# Altium footprint library Connectors.PCBLIB: 109 footprints (part 6 of 7)
Each footprint in its own frame and in the unit in brackets; x right, y up, seen from the top. Pads: shape width x height; smd on the part's side, far side on the other; paste and mask are expansions set on the pad; w line width, h text height; cw(c..) or ccw(c..) is an arc to the next point about the centre after c.
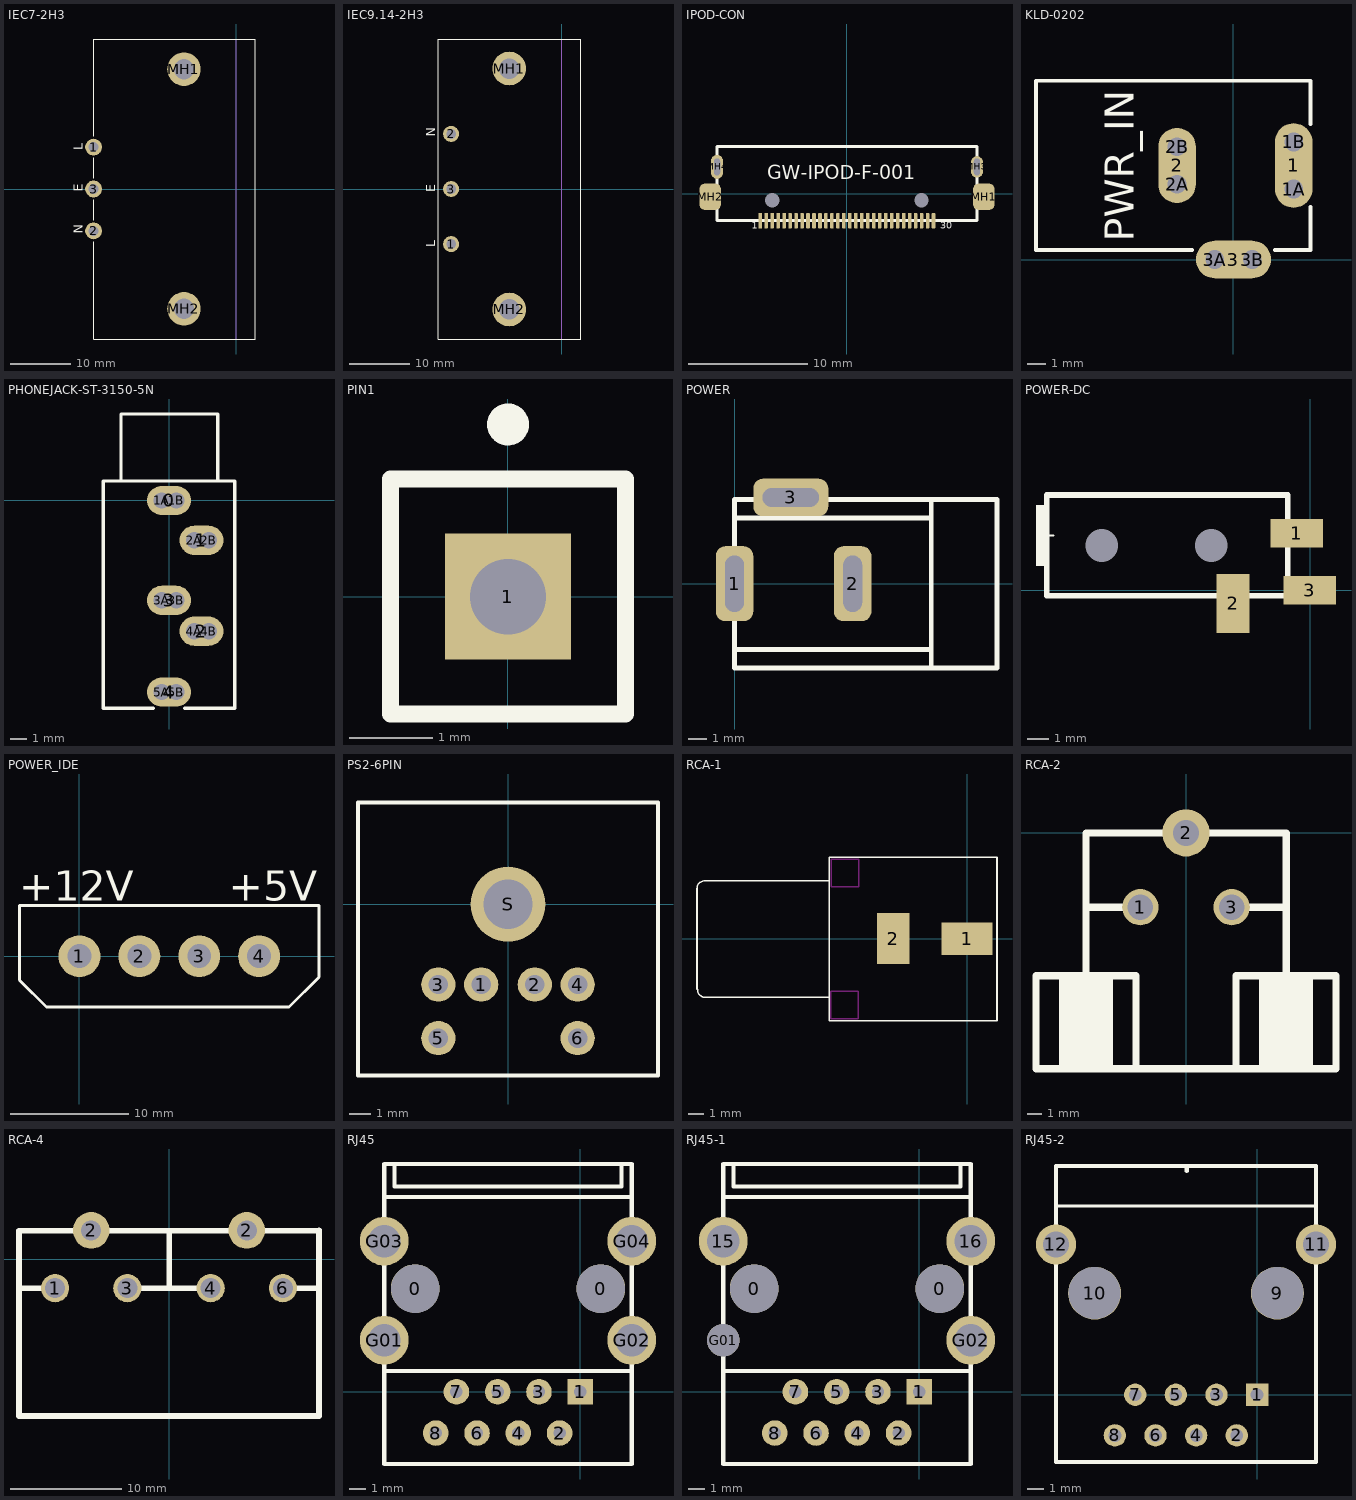
[diagram p5: the footprints below, top view; thin cyan lines are the x and y axes]

## IEC7-2H3 [mm] "Mains Power Outlet, IEC60 320-2-2 F, PC Flange Rear Mount"
height 30.4
pads (5):
  round 2.8 hole 1.7: 1(-23.8,7) 2(-23.8,-7) 3(-23.8,0)
  round 5.6 hole 3.4: MH1(-8.7,20) MH2(-8.7,-20)
Top Overlay:
  lines w0.2: -23.8,-8.8 -23.8,-25.05 3.2,-25.05 3.2,25.05 -23.8,25.05 -23.8,8.8 ; -23.8,-5.2 -23.8,-1.8 ; -23.8,1.8 -23.8,5.2
  text "L" at -25.6,6.5 h1.5
  text "E" at -25.6,-0.5 h1.5
  text "N" at -25.6,-7.5 h1.5
Mechanical 1:
  lines w0.1: 0,-25.05 0,25.05
  text "PCB Edge" at -0.4,-24.4 h0.5

## IEC9.14-2H3 [mm] "Mains Power Inlet, IEC60 320-1 C14, PC Flange Rear Mount"
height 27.8
pads (5):
  round 2.65 hole 1.6: 1(-18.35,-9.14) 2(-18.35,9.14) 3(-18.35,0)
  round 5.6 hole 3.4: MH1(-8.7,20) MH2(-8.7,-20)
Top Overlay:
  lines w0.2: -20.5,-24.9 -20.5,24.9 3.2,24.9 3.2,-24.9 -20.5,-24.9
  text "N" at -21,8.64 h1.5
  text "E" at -21,-0.5 h1.5
  text "L" at -21,-9.64 h1.5
Mechanical 1:
  lines w0.1: 0,-24.9 0,24.9
  text "PCB Edge" at -0.383,-24.4 h0.5

## IPOD-CON [mm]
height 2.5
pads (36):
  rect 0.3x1.3 smd: 1(-7.261,-2.25)
  rrect50% 0.3x1.3 smd: 2(-6.761,-2.25) 3(-6.261,-2.25) 4(-5.761,-2.25) 5(-5.261,-2.25) 6(-4.761,-2.25) 7(-4.261,-2.25) 8(-3.761,-2.25) 9(-3.261,-2.25) 10(-2.761,-2.25) 11(-2.261,-2.25) 12(-1.761,-2.25) 13(-1.261,-2.25) 14(-0.761,-2.25) 15(-0.261,-2.25) 16(0.239,-2.25) 17(0.739,-2.25) 18(1.239,-2.25) 19(1.739,-2.25) 20(2.239,-2.25) 21(2.739,-2.25) 22(3.239,-2.25) 23(3.739,-2.25) 24(4.239,-2.25) 25(4.739,-2.25) 26(5.239,-2.25) 27(5.739,-2.25) 28(6.239,-2.25) 29(6.739,-2.25) 30(7.239,-2.25)
  rrect50% 1.8x2.2 smd: MH1(11.45,-0.25) MH2(-11.45,-0.25)
  oval 1x1.8 hole 0.5 slot 1.4 at 90 deg: MH3(10.875,2.25)
  oval 1x2 hole 0.5 slot 1.4 at 90 deg: MH4(-10.875,2.25)
  rrect50% 0.3x0 hole 1.2: ""(-6.261,-0.55) ""(6.239,-0.55)
Top Overlay:
  lines w0.254: -10.875,-2.25 10.875,-2.25 10.875,3.95 -10.875,3.95 -10.875,-2.25
  text "1" at -7.95,-3.15 h1
  text "30" at 7.798,-3.15 h1
  text "GW-IPOD-F-001" at -6.655,0.813 h2
3D body: height 2.2, standoff 0, extent -11.409,-1.968 11.308,3.632

## KLD-0202 [mm] "DC Power Jack, 2.5mm, KLD Series, PCB Mount"
pads (9):
  oval 2x4.5 all layers, no hole: 1(3.2,5)
  round 1.5 hole 1: 1A(3.2,3.75) 1B(3.2,6.25) 2A(-3,4) 2B(-3,6) 3A(-1,0) 3B(1,0)
  oval 2x4 all layers, no hole: 2(-3,5)
  oval 4x2 all layers, no hole: 3(0,0)
Top Overlay:
  lines w0.2: -2.2,0.5 -10.5,0.5 -10.5,9.5 4.1,9.5 4.1,7.2 ; 2.2,0.5 4.1,0.5 4.1,2.8
  text "PWR_IN" at -5.293,0.936 h1.52
Mechanical 2:
  lines w1: -3,4 -3,6 ; -1,0 1,0 ; 3.2,3.75 3.2,6.25

## PHONEJACK-ST-3150-5N [mm] "Connector; Stereo Jack, 3.5mm, 5 Position"
pads (15):
  oval 2.7x1.8 all layers, no hole: 0(0,0) 1(2,-2.45) 2(2,-8.05) 3(0,-6.15) 4(0,-11.8)
  round 1.2 hole 1: 1A(-0.45,0) 1B(0.45,0) 2A(1.55,-2.45) 2B(2.45,-2.45) 3A(-0.45,-6.15) 3B(0.45,-6.15) 4A(1.55,-8.05) 4B(2.45,-8.05) 5A(-0.45,-11.8) 5B(0.45,-11.8)
Top Overlay:
  lines w0.2: -2.96,1.263 -2.96,5.327 3.009,5.327 3.009,1.263 ; -0.95,-12.8 -4.05,-12.8 -4.05,1.2 4.05,1.2 4.05,-12.8 0.95,-12.8
Mechanical 2:
  lines w1: -0.45,-11.8 0.45,-11.8 ; -0.45,-6.15 0.45,-6.15 ; -0.45,0 0.45,0 ; 1.55,-8.05 2.45,-8.05 ; 1.55,-2.45 2.45,-2.45

## PIN1 [mm] "Connector; Coax-F"
pads (1):
  rect 1.5x1.5 hole 0.9: 1(0,0)
Top Overlay:
  circle w0.25: c0,2.05 r0.125
  lines w0.2: -1.4,-1.4 -1.4,1.4 1.4,1.4 1.4,-1.4 -1.4,-1.4
3D body: height 8.54, standoff -3, extent -1.27,-1.27 1.27,1.27

## POWER [mm]
pads (3):
  rrect50% 2x4 hole 1 slot 3 at 90 deg: 1(0,0) 2(6.3,0)
  rrect50% 4x2 hole 1 slot 3 at 0 deg: 3(3,4.6)
Top Overlay:
  lines w0.254: 0,-3.505 10.49,-3.505 ; 0,3.505 10.49,3.505 ; 10.49,-4.496 10.49,4.496 ; 0,-4.496 0,4.496 13.995,4.496 13.995,-4.496 0,-4.496
3D body: height 11.02, standoff -3.48, extent -0.043,-4.503 13.783,5.003

## POWER-DC [mm]
pads (5):
  round 0 hole 1.5 mask+0: 0(-9.521,2.057) 0(-4.521,2.057)
  rect 2.4x1.3 smd: 1(-0.621,2.607) 3(-0.021,0.007)
  rect 1.5x2.7 smd: 2(-3.521,-0.593)
Top Overlay:
  rectangle: -12.521,1.107 -11.921,3.907
  lines w0.1: -12.221,2.507 -11.721,2.507
  lines w0.254: -12.021,-0.243 -12.021,4.357 -1.021,4.357 -1.021,-0.243 -12.021,-0.243
3D body: height 4.4, standoff -0.8, extent -11.996,-1.818 0.604,4.482

## POWER_IDE [mil]
pads (4):
  round 140 hole 80: 1(0,0) 2(200,0) 3(400,0) 4(600,0)
Top Overlay:
  lines w10: 640,-170 700,-170 ; 800,-40 800,-70 ; 700,-170 800,-70 ; 700,-170 -110,-170 -200,-80 -200,170 800,170 800,-70
  text "+12V" at -202,185 h100
  text "+5V" at 498,185 h100
3D body: height 480, standoff 0, extent -158,-174 762,176

## PS2-6PIN [mm] "PS2 Socket, 6 Pin, Through Hole"
pads (7):
  round 1.6 hole 0.9: 1(-1.25,-3.75) 2(1.25,-3.75) 3(-3.25,-3.75) 4(3.25,-3.75) 5(-3.25,-6.25) 6(3.25,-6.25)
  round 3.5 hole 2.3: S(0,0)
Top Overlay:
  lines w0.2: -7,-8 7,-8 7,4.75 -7,4.75 -7,-8

## RCA-1 [mm]
pads (2):
  rect 3.3x2.1 all layers, no hole: 1(0,0)
  rect 2.1x3.3 all layers, no hole: 2(-4.75,0)
Top Overlay:
  lines w0.1: -17.383,-3.242 -17.383,3.225 cw(c-16.883,3.225) -16.875,3.725 -8.875,3.725 ; -17.35,-3.275 ccw(c-16.85,-3.283) -16.85,-3.783 ; -16.875,-3.775 -8.875,-3.775 ; -8.875,-5.275 -8.875,5.225 1.925,5.225 1.925,-5.275 -8.875,-5.275
Keep-Out Layer:
  lines w0.1: -8.775,-5.125 -8.75,-5.15 -7,-5.15 -7,-3.375 -8.775,-3.375 -8.775,-5.125 ; -8.75,3.325 -8.75,5.1 -6.975,5.1 -6.975,3.325 -8.75,3.325
Mechanical 1:
  lines w0.1: -5.375,-1.225 -4.175,-1.225 -4.175,1.175 -5.375,1.175 -5.375,-1.225 ; -1.175,-0.625 -1.175,0.575 1.225,0.575 1.225,-0.625 -1.175,-0.625
3D body: height 11.86, standoff -3.64, extent -17.628,-5 1.872,5

## RCA-2 [mm]
pads (3):
  round 2.54 hole 1.8: 1(-3.2,-5.2) 3(3.2,-5.2)
  round 3.3 hole 1.8: 2(0,0)
Top Overlay:
  rectangle: -8.738,-16.5 -5.309,-10
  rectangle: 5.283,-16.5 8.738,-10
  lines w0.254: -8.75,-16.5 -8.75,-10 ; -5.25,-16.5 -5.25,-10 ; 5.25,-16.5 5.25,-10 ; 8.75,-16.5 8.75,-10
  lines w0.508: -7,-5.2 -3.25,-5.2 ; -3.5,-16.5 -3.5,-10 -7,-10 -10.5,-10 -10.5,-16.5 -7,-16.5 ; 3.19,-5.2 7,-5.2 ; 3.5,-16.5 3.5,-10 7,-10 10.5,-10 10.5,-16.5 7.017,-16.5 7.017,0 ; 7,-16.5 -7,-16.5 ; 7,0 -7,0 -7,-16.5
3D body: height 28.01, standoff -4.39, extent -8.371,-19.634 12.029,0.166

## RCA-4 [mm]
pads (6):
  round 2.54 hole 1.8: 1(-10.25,-2.6) 3(-3.75,-2.6) 4(3.75,-2.6) 6(10.25,-2.6)
  round 3.3 hole 1.8: 2(-7,2.6) 2(7,2.6)
Top Overlay:
  lines w0.508: -13.483,-2.6 -10.25,-2.6 ; -3.81,-2.6 3.81,-2.6 ; 0.017,-2.505 0.017,2.575 ; 10.25,-2.6 13.467,-2.6 ; 12.971,2.575 13.479,2.575 ; 13.5,2.575 -13.5,2.575 -13.5,-14.1 13.5,-14.1 13.5,2.6
3D body: height 27.31, standoff -5.59, extent -17.324,-17.231 17.476,2.819

## RJ45 [mil]
pads (14):
  round 118.11 hole 118.11: 0(-400,250) 0(50,250)
  rect 62x62 hole 30: 1(0,0)
  round 62 hole 30: 2(-50,-100) 3(-100,0) 4(-150,-100) 5(-200,0) 6(-250,-100) 7(-300,0) 8(-350,-100)
  round 118.11 hole 78.74: G01(-475,125) G02(125,125) G03(-475,365) G04(125,365)
Top Overlay:
  lines w10: -475,50 125,50 ; -475,472.24 125,472.24 ; -450,547.24 -450,497.24 100,497.24 100,547.24 ; -475,-175 -475,500 -475,552.18 125,552.18 125,500 125,-175 -475,-175
3D body: height 572.83, standoff -141.73, extent -523,-293.44 169.91,651.44

## RJ45-1 [mil]
pads (14):
  round 118.11 hole 118.11: 0(-400,250) 0(50,250)
  rect 62x62 hole 30: 1(0,0)
  round 62 hole 30: 2(-50,-100) 3(-100,0) 4(-150,-100) 5(-200,0) 6(-250,-100) 7(-300,0) 8(-350,-100)
  round 118.11 hole 78.74: 15(-475,365) 16(125,365) G02(125,125)
  round 78.74 hole 78.74: G01(-475,125)
Top Overlay:
  lines w10: -475,50 125,50 ; -475,472.24 125,472.24 ; -450,547.24 -450,497.24 100,497.24 100,547.24 ; -475,-175 -475,500 -475,552.18 125,552.18 125,500 125,-175 -475,-175
3D body: height 572.83, standoff -141.73, extent -523,-293.44 169.91,651.44

## RJ45-2 [mil]
pads (12):
  rect 55x55 hole 31.5: 1(0,0)
  round 55 hole 31.5: 2(-50,-100) 3(-100,0) 4(-150,-100) 5(-200,0) 6(-250,-100) 7(-300,0) 8(-350,-100)
  round 130 hole 127.95 unplated: 9(50,250) 10(-400,250)
  round 98.42 hole 62.99: 11(145,370) 12(-495,370)
Top Overlay:
  lines w8: -488.19,464.57 141.73,464.57
  lines w10: -495,-165.35 144.65,-165.35 145,-165 145,370 145,562.99 -495,562.99 -495,370 -495,-165 ; -173.23,551.18 -173.23,559.06
3D body: height 127.85, standoff -555.12, extent -490,-172.17 139.92,556.17